# Altium footprint library PcbLib1.PcbLib: 1016 footprints (part 62 of 64)
Each footprint in its own frame and in the unit in brackets; x right, y up, seen from the top. Pads: shape width x height; smd on the part's side, far side on the other; paste and mask are expansions set on the pad; w line width, h text height; cw(c..) or ccw(c..) is an arc to the next point about the centre after c.
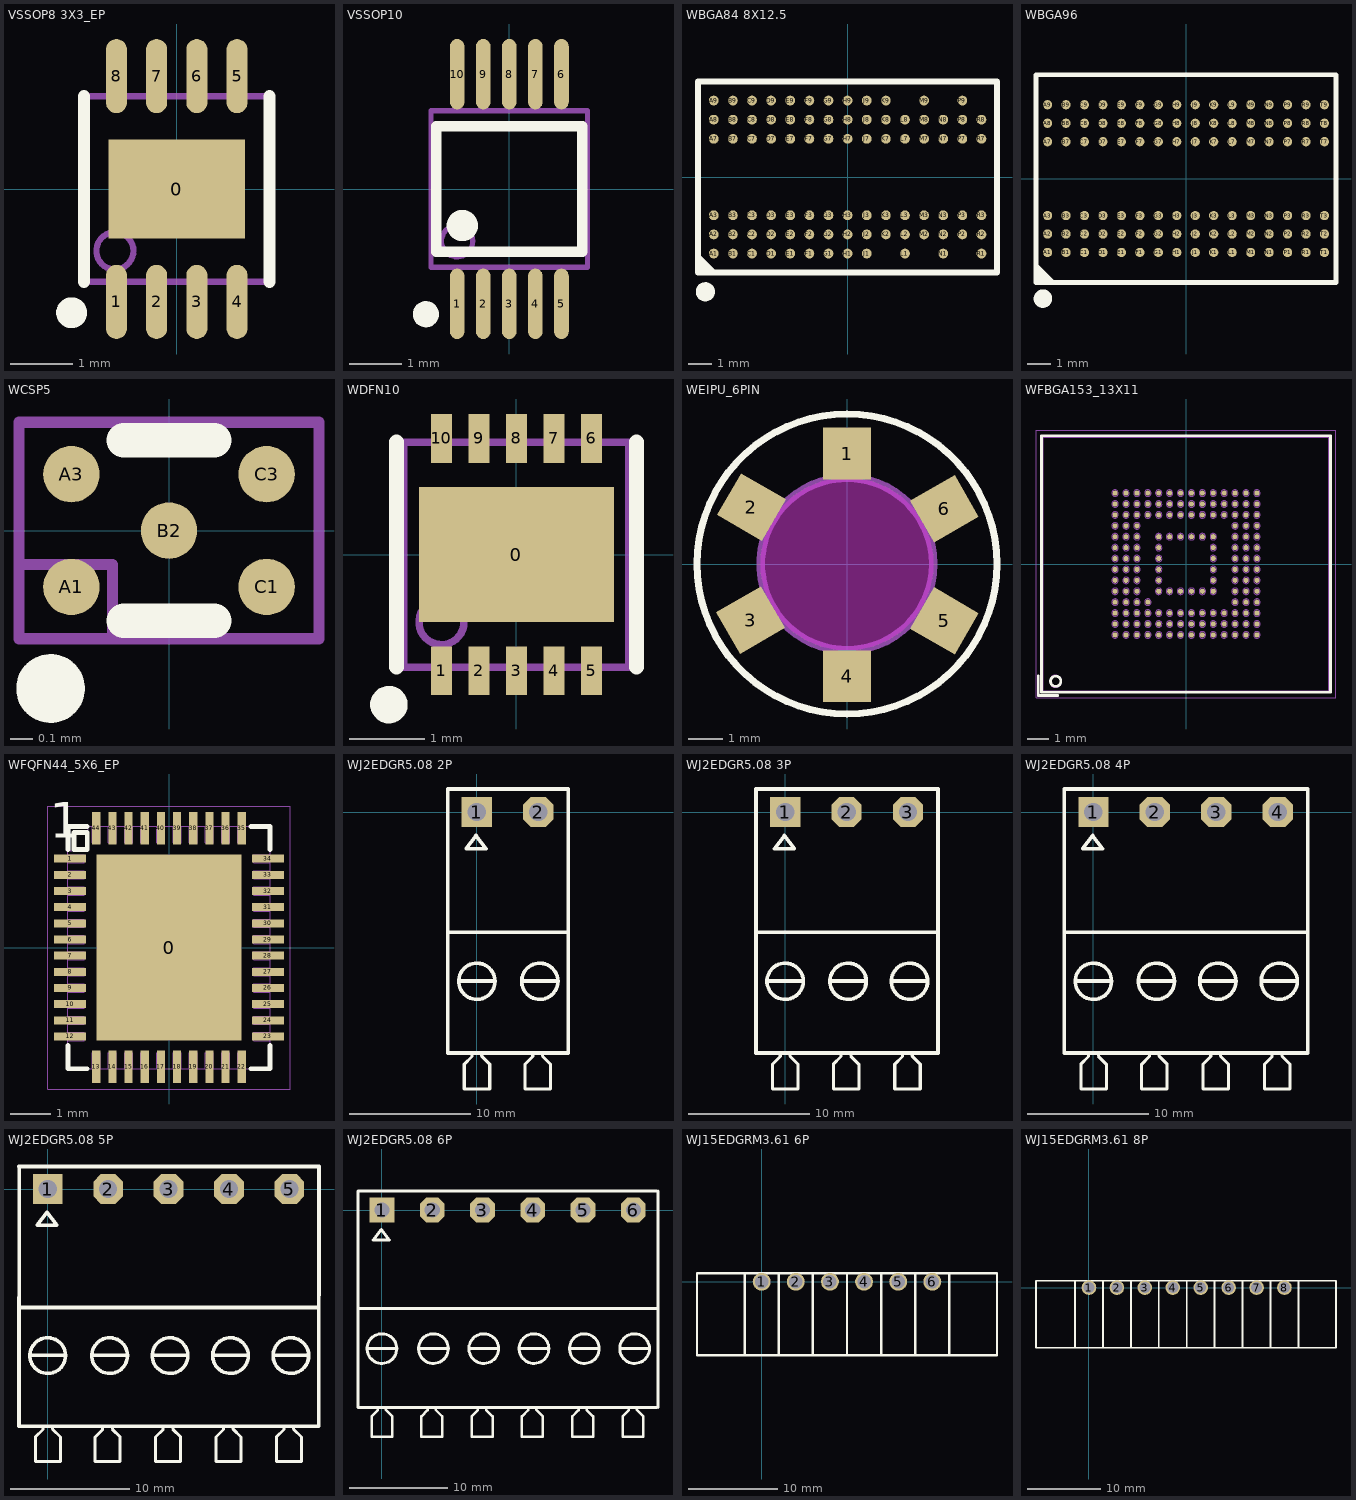
[diagram p61: the footprints below, top view; thin cyan lines are the x and y axes]

## VSSOP8 3X3_EP [mm]
pads (9):
  rect 2.2x1.6 smd mask+0.051: 0(0,0)
  oval 0.34x1.2 smd: 1(-0.975,-1.825) 2(-0.325,-1.825) 3(0.325,-1.825) 4(0.975,-1.825) 5(0.975,1.825) 6(0.325,1.825) 7(-0.325,1.825) 8(-0.975,1.825)
Top Overlay:
  circle w0.25: c-1.7,-2 r0.125
  lines w0.2: -1.5,-1.5 -1.5,1.5 ; 1.5,-1.5 1.5,1.5
Mechanical 13:
  circle w0.1: c-1,-1 r0.3
  lines w0.1: -1.5,-1.5 1.5,-1.5 1.5,1.5 -1.5,1.5 -1.5,-1.5

## VSSOP10 [mm]
pads (10):
  oval 0.28x1.35 smd mask+0.051: 1(-1,-2.2) 2(-0.5,-2.2) 3(0,-2.2) 4(0.5,-2.2) 5(1,-2.2) 6(1,2.2) 7(0.5,2.2) 8(0,2.2) 9(-0.5,2.2) 10(-1,2.2)
Top Overlay:
  circle w0.25: c-1.6,-2.4 r0.125
  circle w0.35: c-0.9,-0.7 r0.125
  lines w0.2: -1.4,-1.2 -1.4,1.2 1.4,1.2 1.4,-1.2 -1.4,-1.2
Mechanical 13:
  circle w0.1: c-1,-1 r0.3
  lines w0.1: -1.5,-1.5 -1.5,1.5 1.5,1.5 1.5,-1.5 -1.5,-1.5

## WBGA84 8X12.5 [mm]
pads (84):
  round 0.41 smd mask+0.051: A1(-5.6,-3.2) A2(-5.6,-2.4) A3(-5.6,-1.6) A7(-5.6,1.6) A8(-5.6,2.4) A9(-5.6,3.2) B1(-4.8,-3.2) B2(-4.8,-2.4) B3(-4.8,-1.6) B7(-4.8,1.6) B8(-4.8,2.4) B9(-4.8,3.2) C1(-4,-3.2) C2(-4,-2.4) C3(-4,-1.6) C7(-4,1.6) C8(-4,2.4) C9(-4,3.2) D1(-3.2,-3.2) D2(-3.2,-2.4) D3(-3.2,-1.6) D7(-3.2,1.6) D8(-3.2,2.4) D9(-3.2,3.2) E1(-2.4,-3.2) E2(-2.4,-2.4) E3(-2.4,-1.6) E7(-2.4,1.6) E8(-2.4,2.4) E9(-2.4,3.2) F1(-1.6,-3.2) F2(-1.6,-2.4) F3(-1.6,-1.6) F7(-1.6,1.6) F8(-1.6,2.4) F9(-1.6,3.2) G1(-0.8,-3.2) G2(-0.8,-2.4) G3(-0.8,-1.6) G7(-0.8,1.6) G8(-0.8,2.4) G9(-0.8,3.2) H1(0,-3.2) H2(0,-2.4) H3(0,-1.6) H7(0,1.6) H8(0,2.4) H9(0,3.2) J1(0.8,-3.2) J2(0.8,-2.4) J3(0.8,-1.6) J7(0.8,1.6) J8(0.8,2.4) J9(0.8,3.2) K2(1.6,-2.4) K3(1.6,-1.6) K7(1.6,1.6) K8(1.6,2.4) K9(1.6,3.2) L1(2.4,-3.2) L2(2.4,-2.4) L3(2.4,-1.6) L7(2.4,1.6) L8(2.4,2.4) M2(3.2,-2.4) M3(3.2,-1.6) M7(3.2,1.6) M8(3.2,2.4) M9(3.2,3.2) N1(4,-3.2) N2(4,-2.4) N3(4,-1.6) N7(4,1.6) N8(4,2.4) P2(4.8,-2.4) P3(4.8,-1.6) P7(4.8,1.6) P8(4.8,2.4) P9(4.8,3.2) R1(5.6,-3.2) R2(5.6,-2.4) R3(5.6,-1.6) R7(5.6,1.6) R8(5.6,2.4)
Top Overlay:
  circle w0.4: c-5.95,-4.8 r0.2
  region: -6.3,-4.07 -5.369,-4.07 -6.296,-3.143 -6.3,-3.143
  lines w0.254: -6.25,-4 6.25,-4 6.25,4 -6.25,4 -6.25,-4

## WBGA96 [mm]
pads (96):
  round 0.4 smd mask+0.051: A1(-6,-3.2) A2(-6,-2.4) A3(-6,-1.6) A7(-6,1.6) A8(-6,2.4) A9(-6,3.2) B1(-5.2,-3.2) B2(-5.2,-2.4) B3(-5.2,-1.6) B7(-5.2,1.6) B8(-5.2,2.4) B9(-5.2,3.2) C1(-4.4,-3.2) C2(-4.4,-2.4) C3(-4.4,-1.6) C7(-4.4,1.6) C8(-4.4,2.4) C9(-4.4,3.2) D1(-3.6,-3.2) D2(-3.6,-2.4) D3(-3.6,-1.6) D7(-3.6,1.6) D8(-3.6,2.4) D9(-3.6,3.2) E1(-2.8,-3.2) E2(-2.8,-2.4) E3(-2.8,-1.6) E7(-2.8,1.6) E8(-2.8,2.4) E9(-2.8,3.2) F1(-2,-3.2) F2(-2,-2.4) F3(-2,-1.6) F7(-2,1.6) F8(-2,2.4) F9(-2,3.2) G1(-1.2,-3.2) G2(-1.2,-2.4) G3(-1.2,-1.6) G7(-1.2,1.6) G8(-1.2,2.4) G9(-1.2,3.2) H1(-0.4,-3.2) H2(-0.4,-2.4) H3(-0.4,-1.6) H7(-0.4,1.6) H8(-0.4,2.4) H9(-0.4,3.2) J1(0.4,-3.2) J2(0.4,-2.4) J3(0.4,-1.6) J7(0.4,1.6) J8(0.4,2.4) J9(0.4,3.2) K1(1.2,-3.2) K2(1.2,-2.4) K3(1.2,-1.6) K7(1.2,1.6) K8(1.2,2.4) K9(1.2,3.2) L1(2,-3.2) L2(2,-2.4) L3(2,-1.6) L7(2,1.6) L8(2,2.4) L9(2,3.2) M1(2.8,-3.2) M2(2.8,-2.4) M3(2.8,-1.6) M7(2.8,1.6) M8(2.8,2.4) M9(2.8,3.2) N1(3.6,-3.2) N2(3.6,-2.4) N3(3.6,-1.6) N7(3.6,1.6) N8(3.6,2.4) N9(3.6,3.2) P1(4.4,-3.2) P2(4.4,-2.4) P3(4.4,-1.6) P7(4.4,1.6) P8(4.4,2.4) P9(4.4,3.2) R1(5.2,-3.2) R2(5.2,-2.4) R3(5.2,-1.6) R7(5.2,1.6) R8(5.2,2.4) R9(5.2,3.2) T1(6,-3.2) T2(6,-2.4) T3(6,-1.6) T7(6,1.6) T8(6,2.4) T9(6,3.2)
Top Overlay:
  circle w0.4: c-6.2,-5.2 r0.2
  region: -6.5,-4.563 -5.569,-4.563 -6.496,-3.637 -6.5,-3.637
  lines w0.2: -6.5,-4.5 6.5,-4.5 6.5,4.5 -6.5,4.5 -6.5,-4.5

## WCSP5 [mm]
pads (5):
  round 0.25 smd mask+0.051: A1(-0.433,-0.25) A3(-0.433,0.25) B2(0,0) C1(0.433,-0.25) C3(0.433,0.25)
Top Overlay:
  circle w0.152: c-0.525,-0.7 r0.076
  lines w0.152: -0.2,-0.4 0.2,-0.4 ; -0.2,0.4 0.2,0.4
Mechanical 13:
  lines w0.05: -0.665,-0.15 -0.25,-0.15 -0.25,-0.48 ; -0.665,-0.48 0.665,-0.48 0.665,0.48 -0.665,0.48 -0.665,-0.48

## WDFN10 [mm]
pads (11):
  rect 2.6x1.8 smd mask+0.051: 0(0,0)
  rect 0.28x0.65 smd mask+0.051: 1(-1,-1.55) 2(-0.5,-1.55) 3(0,-1.55) 4(0.5,-1.55) 5(1,-1.55) 6(1,1.55) 7(0.5,1.55) 8(0,1.55) 9(-0.5,1.55) 10(-1,1.55)
Top Overlay:
  circle w0.25: c-1.7,-2 r0.125
  lines w0.2: -1.6,-1.5 -1.6,1.5 ; 1.6,-1.5 1.6,1.5
Mechanical 13:
  circle w0.1: c-1,-0.9 r0.3
  lines w0.1: -1.5,-1.5 -1.5,1.5 1.5,1.5 1.5,-1.5 -1.5,-1.5

## WEIPU_6PIN [mm]
pads (6):
  rect 1.4x1.5 smd mask+0.051: 1(0,3.2) 4(0,-3.251)
  rect 1.4x1.5 smd rot 60 mask+0.051: 2(-2.769,1.651) 5(2.819,-1.651)
  rect 1.4x1.5 smd rot 120 mask+0.051: 3(-2.794,-1.626) 6(2.819,1.6)
Top Overlay:
  circle w0.203: c0,0 r4.347
Keep-Out Layer:
  board cut-out: 0,-2.5 -0.246,-2.5 -0.729,-2.404 -1.184,-2.215 -1.594,-1.942 -1.942,-1.594 -2.215,-1.184 -2.404,-0.729 -2.5,-0.246 -2.5,0 -2.5,0.246 -2.404,0.729 -2.215,1.184 -1.942,1.594 -1.594,1.942 -1.184,2.215 -0.729,2.404 -0.246,2.5 0,2.5 0.246,2.5 0.729,2.404 1.184,2.215 1.594,1.942 1.942,1.594 2.215,1.184 2.404,0.729 2.5,0.246 2.5,0 2.5,-0.246 2.404,-0.729 2.215,-1.184 1.942,-1.594 1.594,-1.942 1.184,-2.215 0.729,-2.404 0.246,-2.5
Mechanical 1:
  circle w0.254: c0,0 r2.5

## WFBGA153_13X11 [mm]
pads (153):
  round 0.23 smd mask+0.05: A1(-3.25,-3.25) A2(-3.25,-2.75) A3(-3.25,-2.25) A4(-3.25,-1.75) A5(-3.25,-1.25) A6(-3.25,-0.75) A7(-3.25,-0.25) A8(-3.25,0.25) A9(-3.25,0.75) A10(-3.25,1.25) A11(-3.25,1.75) A12(-3.25,2.25) A13(-3.25,2.75) A14(-3.25,3.25) B1(-2.75,-3.25) B2(-2.75,-2.75) B3(-2.75,-2.25) B4(-2.75,-1.75) B5(-2.75,-1.25) B6(-2.75,-0.75) B7(-2.75,-0.25) B8(-2.75,0.25) B9(-2.75,0.75) B10(-2.75,1.25) B11(-2.75,1.75) B12(-2.75,2.25) B13(-2.75,2.75) B14(-2.75,3.25) C1(-2.25,-3.25) C2(-2.25,-2.75) C3(-2.25,-2.25) C4(-2.25,-1.75) C5(-2.25,-1.25) C6(-2.25,-0.75) C7(-2.25,-0.25) C8(-2.25,0.25) C9(-2.25,0.75) C10(-2.25,1.25) C11(-2.25,1.75) C12(-2.25,2.25) C13(-2.25,2.75) C14(-2.25,3.25) D1(-1.75,-3.25) D2(-1.75,-2.75) D3(-1.75,-2.25) D4(-1.75,-1.75) D12(-1.75,2.25) D13(-1.75,2.75) D14(-1.75,3.25) E1(-1.25,-3.25) E2(-1.25,-2.75) E3(-1.25,-2.25) E5(-1.25,-1.25) E6(-1.25,-0.75) E7(-1.25,-0.25) E8(-1.25,0.25) E9(-1.25,0.75) E10(-1.25,1.25) E12(-1.25,2.25) E13(-1.25,2.75) E14(-1.25,3.25) F1(-0.75,-3.25) F2(-0.75,-2.75) F3(-0.75,-2.25) F5(-0.75,-1.25) F10(-0.75,1.25) F12(-0.75,2.25) F13(-0.75,2.75) F14(-0.75,3.25) G1(-0.25,-3.25) G2(-0.25,-2.75) G3(-0.25,-2.25) G5(-0.25,-1.25) G10(-0.25,1.25) G12(-0.25,2.25) G13(-0.25,2.75) G14(-0.25,3.25) H1(0.25,-3.25) H2(0.25,-2.75) H3(0.25,-2.25) H5(0.25,-1.25) H10(0.25,1.25) H12(0.25,2.25) H13(0.25,2.75) H14(0.25,3.25) J1(0.75,-3.25) J2(0.75,-2.75) J3(0.75,-2.25) J5(0.75,-1.25) J10(0.75,1.25) J12(0.75,2.25) J13(0.75,2.75) J14(0.75,3.25) K1(1.25,-3.25) K2(1.25,-2.75) K3(1.25,-2.25) K5(1.25,-1.25) K6(1.25,-0.75) K7(1.25,-0.25) K8(1.25,0.25) K9(1.25,0.75) K10(1.25,1.25) K12(1.25,2.25) K13(1.25,2.75) K14(1.25,3.25) L1(1.75,-3.25) L2(1.75,-2.75) L3(1.75,-2.25) L12(1.75,2.25) L13(1.75,2.75) L14(1.75,3.25) M1(2.25,-3.25) M2(2.25,-2.75) M3(2.25,-2.25) M4(2.25,-1.75) M5(2.25,-1.25) M6(2.25,-0.75) M7(2.25,-0.25) M8(2.25,0.25) M9(2.25,0.75) M10(2.25,1.25) M11(2.25,1.75) M12(2.25,2.25) M13(2.25,2.75) M14(2.25,3.25) N1(2.75,-3.25) N2(2.75,-2.75) N3(2.75,-2.25) N4(2.75,-1.75) N5(2.75,-1.25) N6(2.75,-0.75) N7(2.75,-0.25) N8(2.75,0.25) N9(2.75,0.75) N10(2.75,1.25) N11(2.75,1.75) N12(2.75,2.25) N13(2.75,2.75) N14(2.75,3.25) P1(3.25,-3.25) P2(3.25,-2.75) P3(3.25,-2.25) P4(3.25,-1.75) P5(3.25,-1.25) P6(3.25,-0.75) P7(3.25,-0.25) P8(3.25,0.25) P9(3.25,0.75) P10(3.25,1.25) P11(3.25,1.75) P12(3.25,2.25) P13(3.25,2.75) P14(3.25,3.25)
Top Overlay:
  circle w0.12: c-5.975,-5.375 r0.236
  lines w0.12: -6.775,-5.125 -6.775,-6.025 -5.875,-6.025 ; -6.625,-5.875 6.625,-5.875 6.625,5.875 -6.625,5.875 -6.625,-5.875
Mechanical 14:
  drawing of 158 lines, arcs and shapes, not listed
Mechanical 16:
  lines w0.01: -6.875,-6.125 6.875,-6.125 6.875,6.125 -6.875,6.125 -6.875,-6.125
3D body "WFBGA-153.STEP": height 0.78, standoff -0.02, extent -6.5,-5.75 6.5,5.75
3D body: height 1, standoff 0, extent -6.555,-5.805 6.555,5.805

## WFQFN44_5X6_EP [mm]
pads (45):
  rect 3.6x4.6 smd paste-1.8 mask+0.05: 0(0,0)
  rect 0.8x0.2 smd mask+0.05: 1(-2.45,2.2) 2(-2.45,1.8) 3(-2.45,1.4) 4(-2.45,1) 5(-2.45,0.6) 6(-2.45,0.2) 7(-2.45,-0.2) 8(-2.45,-0.6) 9(-2.45,-1) 10(-2.45,-1.4) 11(-2.45,-1.8) 12(-2.45,-2.2) 23(2.45,-2.2) 24(2.45,-1.8) 25(2.45,-1.4) 26(2.45,-1) 27(2.45,-0.6) 28(2.45,-0.2) 29(2.45,0.2) 30(2.45,0.6) 31(2.45,1) 32(2.45,1.4) 33(2.45,1.8) 34(2.45,2.2)
  rect 0.2x0.8 smd mask+0.05: 13(-1.8,-2.95) 14(-1.4,-2.95) 15(-1,-2.95) 16(-0.6,-2.95) 17(-0.2,-2.95) 18(0.2,-2.95) 19(0.6,-2.95) 20(1,-2.95) 21(1.4,-2.95) 22(1.8,-2.95) 35(1.8,2.95) 36(1.4,2.95) 37(1,2.95) 38(0.6,2.95) 39(0.2,2.95) 40(-0.2,2.95) 41(-0.6,2.95) 42(-1,2.95) 43(-1.4,2.95) 44(-1.8,2.95)
Top Overlay:
  lines w0.12: -2.5,-2.425 -2.5,-3 -2.025,-3 ; -2.5,2.425 -2.5,3 -2.025,3 ; 2.025,-3 2.5,-3 2.5,-2.425 ; 2.025,3 2.5,3 2.5,2.425 ; -2.35,2.425 -2.35,2.85 -2.025,2.85 -2.025,2.425 -2.35,2.425
  text "1" at -2.95,2.425 h1.5
Top Paste:
  rectangle: -0.5,0.1 -0.1,0.475
  rectangle: -0.5,0.675 -0.1,1.05
  rectangle: -0.5,1.25 -0.1,1.625
  rectangle: -0.5,1.825 -0.1,2.2
  rectangle: -1.1,1.825 -0.7,2.2
  rectangle: -1.1,1.25 -0.7,1.625
  rectangle: -1.1,0.675 -0.7,1.05
  rectangle: -1.1,0.1 -0.7,0.475
  rectangle: -1.7,1.825 -1.3,2.2
  rectangle: -1.7,1.25 -1.3,1.625
  rectangle: -1.7,0.675 -1.3,1.05
  rectangle: -1.7,0.1 -1.3,0.475
  rectangle: 0.1,0.1 0.5,0.475
  rectangle: 0.1,0.675 0.5,1.05
  rectangle: 0.1,1.25 0.5,1.625
  rectangle: 0.1,1.825 0.5,2.2
  rectangle: 0.7,0.1 1.1,0.475
  rectangle: 0.7,0.675 1.1,1.05
  rectangle: 0.7,1.25 1.1,1.625
  rectangle: 0.7,1.825 1.1,2.2
  rectangle: 1.3,1.825 1.7,2.2
  rectangle: 1.3,1.25 1.7,1.625
  rectangle: 1.3,0.675 1.7,1.05
  rectangle: 1.3,0.1 1.7,0.475
  rectangle: -1.7,-2.2 -1.3,-1.825
  rectangle: -1.7,-1.625 -1.3,-1.25
  rectangle: -1.7,-1.05 -1.3,-0.675
  rectangle: -1.7,-0.475 -1.3,-0.1
  rectangle: -1.1,-2.2 -0.7,-1.825
  rectangle: -1.1,-1.625 -0.7,-1.25
  rectangle: -1.1,-1.05 -0.7,-0.675
  rectangle: -1.1,-0.475 -0.7,-0.1
  rectangle: -0.5,-0.475 -0.1,-0.1
  rectangle: -0.5,-1.05 -0.1,-0.675
  rectangle: -0.5,-1.625 -0.1,-1.25
  rectangle: -0.5,-2.2 -0.1,-1.825
  rectangle: 0.1,-2.2 0.5,-1.825
  rectangle: 0.1,-1.625 0.5,-1.25
  rectangle: 0.1,-1.05 0.5,-0.675
  rectangle: 0.1,-0.475 0.5,-0.1
  rectangle: 0.7,-2.2 1.1,-1.825
  rectangle: 0.7,-1.625 1.1,-1.25
  rectangle: 0.7,-1.05 1.1,-0.675
  rectangle: 0.7,-0.475 1.1,-0.1
  rectangle: 1.3,-0.475 1.7,-0.1
  rectangle: 1.3,-1.05 1.7,-0.675
  rectangle: 1.3,-1.625 1.7,-1.25
  rectangle: 1.3,-2.2 1.7,-1.825
Mechanical 14:
  lines w0.01: -2.5,-2.3 -2.1,-2.3 -2.1,-2.1 -2.5,-2.1 ; -2.5,-1.9 -2.1,-1.9 -2.1,-1.7 -2.5,-1.7 ; -2.5,-1.5 -2.1,-1.5 -2.1,-1.3 -2.5,-1.3 ; -2.5,-1.1 -2.1,-1.1 -2.1,-0.9 -2.5,-0.9 ; -2.5,-0.7 -2.1,-0.7 -2.1,-0.5 -2.5,-0.5 ; -2.5,-0.3 -2.1,-0.3 -2.1,-0.1 -2.5,-0.1 ; -2.5,0.1 -2.1,0.1 -2.1,0.3 -2.5,0.3 ; -2.5,0.5 -2.1,0.5 -2.1,0.7 -2.5,0.7 ; -2.5,0.9 -2.1,0.9 -2.1,1.1 -2.5,1.1 ; -2.5,1.3 -2.1,1.3 -2.1,1.5 -2.5,1.5 ; -2.5,1.7 -2.1,1.7 -2.1,1.9 -2.5,1.9 ; -2.5,2.1 -2.1,2.1 -2.1,2.3 -2.5,2.3 ; -1.9,-3 -1.9,-2.6 -1.7,-2.6 -1.7,-3 ; -1.9,3 -1.9,2.6 -1.7,2.6 -1.7,3 ; -1.5,-3 -1.5,-2.6 -1.3,-2.6 -1.3,-3 ; -1.5,3 -1.5,2.6 -1.3,2.6 -1.3,3 ; -1.1,-3 -1.1,-2.6 -0.9,-2.6 -0.9,-3 ; -1.1,3 -1.1,2.6 -0.9,2.6 -0.9,3 ; -0.7,-3 -0.7,-2.6 -0.5,-2.6 -0.5,-3 ; -0.7,3 -0.7,2.6 -0.5,2.6 -0.5,3 ; -0.3,-3 -0.3,-2.6 -0.1,-2.6 -0.1,-3 ; -0.3,3 -0.3,2.6 -0.1,2.6 -0.1,3 ; 0.1,-3 0.1,-2.6 0.3,-2.6 0.3,-3 ; 0.1,3 0.1,2.6 0.3,2.6 0.3,3 ; 0.5,-3 0.5,-2.6 0.7,-2.6 0.7,-3 ; 0.5,3 0.5,2.6 0.7,2.6 0.7,3 ; 0.9,-3 0.9,-2.6 1.1,-2.6 1.1,-3 ; 0.9,3 0.9,2.6 1.1,2.6 1.1,3 ; 1.3,-3 1.3,-2.6 1.5,-2.6 1.5,-3 ; 1.3,3 1.3,2.6 1.5,2.6 1.5,3 ; 1.7,-3 1.7,-2.6 1.9,-2.6 1.9,-3 ; 1.7,3 1.7,2.6 1.9,2.6 1.9,3 ; 2.5,-2.3 2.1,-2.3 2.1,-2.1 2.5,-2.1 ; 2.5,-1.9 2.1,-1.9 2.1,-1.7 2.5,-1.7 ; 2.5,-1.5 2.1,-1.5 2.1,-1.3 2.5,-1.3 ; 2.5,-1.1 2.1,-1.1 2.1,-0.9 2.5,-0.9 ; 2.5,-0.7 2.1,-0.7 2.1,-0.5 2.5,-0.5 ; 2.5,-0.3 2.1,-0.3 2.1,-0.1 2.5,-0.1 ; 2.5,0.1 2.1,0.1 2.1,0.3 2.5,0.3 ; 2.5,0.5 2.1,0.5 2.1,0.7 2.5,0.7 ; 2.5,0.9 2.1,0.9 2.1,1.1 2.5,1.1 ; 2.5,1.3 2.1,1.3 2.1,1.5 2.5,1.5 ; 2.5,1.7 2.1,1.7 2.1,1.9 2.5,1.9 ; 2.5,2.1 2.1,2.1 2.1,2.3 2.5,2.3 ; -2.5,-3 -2.5,3 2.5,3 2.5,-3 -2.5,-3 ; -2.45,2.4 -2,2.4 -2,2.95 -2.45,2.95 -2.45,2.4 ; -1.75,-2.25 1.75,-2.25 1.75,2.25 -1.5,2.25 -1.75,2 -1.75,-2.25
  text "44" at -2.04,3.05 h0.5
  text "35" at 1.58,3.06 h0.5
  text "34" at 2.525,2.05 h0.5
  text "23" at 2.525,-2.35 h0.5
  text "22" at 1.56,-3.36 h0.5
  text "13" at -2.02,-3.36 h0.5
  text "12" at -2.95,-2.375 h0.5
  text "1" at -2.675,2.05 h0.5
Mechanical 16:
  lines w0.01: -3,-3.5 -2.975,-3.5 3,-3.5 3,3.5 -3,3.5 -3,2.35 -3,-3.5
3D body: height 0.02, standoff 0, extent -1.725,-2.225 1.725,2.225
3D body: height 0.81, standoff 0.8, extent -2.45,2.4 -2,2.95
3D body: height 0.02, standoff 0, extent -1.9,2.6 -1.7,3
3D body: height 0.02, standoff 0, extent -1.5,2.6 -1.3,3
3D body: height 0.02, standoff 0, extent -1.1,2.6 -0.9,3
3D body: height 0.02, standoff 0, extent -0.7,2.6 -0.5,3
3D body: height 0.02, standoff 0, extent -0.3,2.6 -0.1,3
3D body: height 0.02, standoff 0, extent 0.1,2.6 0.3,3
3D body: height 0.02, standoff 0, extent 0.5,2.6 0.7,3
3D body: height 0.02, standoff 0, extent 0.9,2.6 1.1,3
3D body: height 0.02, standoff 0, extent 1.3,2.6 1.5,3
3D body: height 0.02, standoff 0, extent 1.7,2.6 1.9,3
3D body: height 0.02, standoff 0, extent 2.1,2.1 2.5,2.3
3D body: height 0.02, standoff 0, extent 2.1,1.7 2.5,1.9
3D body: height 0.02, standoff 0, extent 2.1,1.3 2.5,1.5
3D body: height 0.02, standoff 0, extent 2.1,0.9 2.5,1.1
3D body: height 0.02, standoff 0, extent 2.1,0.5 2.5,0.7
3D body: height 0.02, standoff 0, extent 2.1,0.1 2.5,0.3
3D body: height 0.02, standoff 0, extent 2.1,-0.3 2.5,-0.1
3D body: height 0.02, standoff 0, extent 2.1,-0.7 2.5,-0.5
3D body: height 0.02, standoff 0, extent 2.1,-1.1 2.5,-0.9
3D body: height 0.02, standoff 0, extent 2.1,-1.5 2.5,-1.3
3D body: height 0.02, standoff 0, extent 2.1,-1.9 2.5,-1.7
3D body: height 0.02, standoff 0, extent 2.1,-2.3 2.5,-2.1
3D body: height 0.02, standoff 0, extent 1.7,-3 1.9,-2.6
3D body: height 0.02, standoff 0, extent 1.3,-3 1.5,-2.6
3D body: height 0.02, standoff 0, extent 0.9,-3 1.1,-2.6
3D body: height 0.02, standoff 0, extent 0.5,-3 0.7,-2.6
3D body: height 0.02, standoff 0, extent 0.1,-3 0.3,-2.6
3D body: height 0.02, standoff 0, extent -0.3,-3 -0.1,-2.6
3D body: height 0.02, standoff 0, extent -0.7,-3 -0.5,-2.6
3D body: height 0.02, standoff 0, extent -1.1,-3 -0.9,-2.6
3D body: height 0.02, standoff 0, extent -1.5,-3 -1.3,-2.6
3D body: height 0.02, standoff 0, extent -1.9,-3 -1.7,-2.6
3D body: height 0.02, standoff 0, extent -2.5,-2.3 -2.1,-2.1
3D body: height 0.02, standoff 0, extent -2.5,-1.9 -2.1,-1.7
3D body: height 0.02, standoff 0, extent -2.5,-1.5 -2.1,-1.3
3D body: height 0.02, standoff 0, extent -2.5,-1.1 -2.1,-0.9
3D body: height 0.02, standoff 0, extent -2.5,-0.7 -2.1,-0.5
3D body: height 0.02, standoff 0, extent -2.5,-0.3 -2.1,-0.1
3D body: height 0.02, standoff 0, extent -2.5,0.1 -2.1,0.3
3D body: height 0.02, standoff 0, extent -2.5,0.5 -2.1,0.7
3D body: height 0.02, standoff 0, extent -2.5,0.9 -2.1,1.1
3D body: height 0.02, standoff 0, extent -2.5,1.3 -2.1,1.5
3D body: height 0.02, standoff 0, extent -2.5,1.7 -2.1,1.9
3D body: height 0.02, standoff 0, extent -2.5,2.1 -2.1,2.3
3D body: height 0.8, standoff 0.02, extent -2.5,-3 2.5,3

## WJ2EDGR5.08 2P [mm]
height 12.7
pads (2):
  rect 2.5x2.5 hole 1.524: 1(0,0)
  oct 2.5x2.5 hole 1.524: 2(5.08,0)
Top Overlay:
  circle w0.305: c0,-14 r1.5
  circle w0.305: c5.207,-14 r1.5
  lines w0.254: -0.406,-19.99 -0.406,-20.218 -1.041,-20.853 -1.041,-22.911 1.067,-22.911 1.067,-20.853 0.406,-20.193 0.406,-19.964 0.356,-19.914 ; 4.623,-19.99 4.623,-20.218 3.988,-20.853 3.988,-22.911 6.096,-22.911 6.096,-20.853 5.436,-20.193 5.436,-19.964 5.385,-19.914
  lines w0.305: -2.413,1.905 7.518,1.905 ; -2.411,1.905 -2.417,-19.939 7.565,-19.939 7.571,1.905 ; -2.362,-9.957 7.569,-9.957 ; -1.397,-13.97 1.397,-13.97 ; 3.81,-13.97 6.604,-13.97 ; -0.889,-3.048 -0.064,-1.947 0.762,-3.048 0.508,-3.048 -0.889,-3.048
3D body "User Library-MSTB 2,5-2-G-5,08 1770711.STEP": height 8.7, standoff -3.4, extent -2.515,-10.04 7.645,1.962

## WJ2EDGR5.08 3P [mm]
height 12.7
pads (3):
  rect 2.5x2.5 hole 1.524: 1(0,0)
  oct 2.5x2.5 hole 1.524: 2(5.08,0) 3(10.16,0)
Top Overlay:
  circle w0.305: c10.287,-14 r1.5
  circle w0.305: c0,-14 r1.5
  circle w0.305: c5.207,-14 r1.5
  lines w0.254: -0.406,-19.99 -0.406,-20.218 -1.041,-20.853 -1.041,-22.911 1.067,-22.911 1.067,-20.853 0.406,-20.193 0.406,-19.964 0.356,-19.914 ; 4.623,-19.99 4.623,-20.218 3.988,-20.853 3.988,-22.911 6.096,-22.911 6.096,-20.853 5.436,-20.193 5.436,-19.964 5.385,-19.914 ; 9.703,-19.99 9.703,-20.218 9.068,-20.853 9.068,-22.911 11.176,-22.911 11.176,-20.853 10.516,-20.193 10.516,-19.964 10.465,-19.914
  lines w0.305: -2.413,1.905 12.651,1.905 12.645,-19.939 -2.417,-19.939 -2.411,1.905 ; -2.388,-9.957 12.649,-9.957 ; -1.397,-13.97 1.397,-13.97 ; 3.81,-13.97 6.604,-13.97 ; 8.89,-13.97 11.684,-13.97 ; -0.889,-3.048 -0.064,-1.947 0.762,-3.048 0.508,-3.048 -0.889,-3.048
3D body "User Library-MSTB 2,5-3-G-5,08 1759020.SLDPRT": height 8.7, standoff -3.4, extent -2.515,-10.04 12.725,1.962

## WJ2EDGR5.08 4P [mm]
height 12.7
pads (4):
  rect 2.5x2.5 hole 1.524: 1(0,0)
  oct 2.5x2.5 hole 1.524: 2(5.08,0) 3(10.16,0) 4(15.24,0)
Top Overlay:
  circle w0.305: c15.367,-14 r1.5
  circle w0.305: c5.207,-14 r1.5
  circle w0.305: c0,-14 r1.5
  circle w0.305: c10.287,-14 r1.5
  lines w0.254: -0.406,-19.99 -0.406,-20.218 -1.041,-20.853 -1.041,-22.911 1.067,-22.911 1.067,-20.853 0.406,-20.193 0.406,-19.964 0.356,-19.914 ; 4.623,-19.99 4.623,-20.218 3.988,-20.853 3.988,-22.911 6.096,-22.911 6.096,-20.853 5.436,-20.193 5.436,-19.964 5.385,-19.914 ; 9.703,-19.99 9.703,-20.218 9.068,-20.853 9.068,-22.911 11.176,-22.911 11.176,-20.853 10.516,-20.193 10.516,-19.964 10.465,-19.914 ; 14.783,-19.99 14.783,-20.218 14.148,-20.853 14.148,-22.911 16.256,-22.911 16.256,-20.853 15.596,-20.193 15.596,-19.964 15.545,-19.914
  lines w0.305: -2.413,1.905 17.679,1.905 ; -2.411,1.905 -2.417,-19.939 17.673,-19.939 ; -2.388,-9.957 17.728,-9.957 ; -1.397,-13.97 1.397,-13.97 ; 3.81,-13.97 6.604,-13.97 ; 8.89,-13.97 11.684,-13.97 ; 13.97,-13.97 16.764,-13.97 ; 17.725,-19.939 17.731,1.905 ; -0.889,-3.048 0.508,-3.048 0.762,-3.048 -0.064,-1.947 -0.889,-3.048
3D body "User Library-MSTB 2,5-4-G-5,08 1759033.STEP": height 8.7, standoff -3.4, extent -2.515,-10.04 17.805,1.962

## WJ2EDGR5.08 5P [mm]
height 12.7
pads (5):
  rect 2.5x2.5 hole 1.524: 1(0,0)
  oct 2.5x2.5 hole 1.524: 2(5.08,0) 3(10.16,0) 4(15.24,0) 5(20.32,0)
Top Overlay:
  circle w0.305: c10.287,-14 r1.5
  circle w0.305: c0,-14 r1.5
  circle w0.305: c5.207,-14 r1.5
  circle w0.305: c15.367,-14 r1.5
  circle w0.305: c20.447,-14 r1.5
  lines w0.254: -0.406,-19.99 -0.406,-20.218 -1.041,-20.853 -1.041,-22.911 1.067,-22.911 1.067,-20.853 0.406,-20.193 0.406,-19.964 0.356,-19.914 ; 4.623,-19.99 4.623,-20.218 3.988,-20.853 3.988,-22.911 6.096,-22.911 6.096,-20.853 5.436,-20.193 5.436,-19.964 5.385,-19.914 ; 9.703,-19.99 9.703,-20.218 9.068,-20.853 9.068,-22.911 11.176,-22.911 11.176,-20.853 10.516,-20.193 10.516,-19.964 10.465,-19.914 ; 14.783,-19.99 14.783,-20.218 14.148,-20.853 14.148,-22.911 16.256,-22.911 16.256,-20.853 15.596,-20.193 15.596,-19.964 15.545,-19.914 ; 19.863,-19.99 19.863,-20.218 19.228,-20.853 19.228,-22.911 21.336,-22.911 21.336,-20.853 20.676,-20.193 20.676,-19.964 20.625,-19.914
  lines w0.305: -2.413,1.905 22.811,1.905 22.805,-19.939 -2.417,-19.939 -2.411,1.905 ; -2.388,-9.957 22.682,-9.957 ; -1.397,-13.97 1.397,-13.97 ; 3.81,-13.97 6.604,-13.97 ; 8.89,-13.97 11.684,-13.97 ; 13.97,-13.97 16.764,-13.97 ; 19.05,-13.97 21.844,-13.97 ; -0.889,-3.048 -0.064,-1.947 0.762,-3.048 0.508,-3.048 -0.889,-3.048
3D body "User Library-MSTB 2,5-5-G-5,08 1759046.STEP": height 8.7, standoff -3.4, extent -2.515,-10.04 22.885,1.962

## WJ2EDGR5.08 6P [mm]
height 12.7
pads (6):
  rect 2.5x2.5 hole 1.524: 1(0,0)
  oct 2.5x2.5 hole 1.524: 2(5.08,0) 3(10.16,0) 4(15.24,0) 5(20.32,0) 6(25.4,0)
Top Overlay:
  circle w0.305: c20.447,-14 r1.5
  circle w0.305: c15.367,-14 r1.5
  circle w0.305: c5.207,-14 r1.5
  circle w0.305: c0,-14 r1.5
  circle w0.305: c10.287,-14 r1.5
  circle w0.305: c25.527,-14 r1.5
  lines w0.254: -0.406,-19.99 -0.406,-20.218 -1.041,-20.853 -1.041,-22.911 1.067,-22.911 1.067,-20.853 0.406,-20.193 0.406,-19.964 0.356,-19.914 ; 4.623,-19.99 4.623,-20.218 3.988,-20.853 3.988,-22.911 6.096,-22.911 6.096,-20.853 5.436,-20.193 5.436,-19.964 5.385,-19.914 ; 9.703,-19.99 9.703,-20.218 9.068,-20.853 9.068,-22.911 11.176,-22.911 11.176,-20.853 10.516,-20.193 10.516,-19.964 10.465,-19.914 ; 14.783,-19.99 14.783,-20.218 14.148,-20.853 14.148,-22.911 16.256,-22.911 16.256,-20.853 15.596,-20.193 15.596,-19.964 15.545,-19.914 ; 19.863,-19.99 19.863,-20.218 19.228,-20.853 19.228,-22.911 21.336,-22.911 21.336,-20.853 20.676,-20.193 20.676,-19.964 20.625,-19.914 ; 24.943,-19.99 24.943,-20.218 24.308,-20.853 24.308,-22.911 26.416,-22.911 26.416,-20.853 25.756,-20.193 25.756,-19.964 25.705,-19.914
  lines w0.305: -2.413,1.905 27.764,1.905 ; -2.411,1.905 -2.417,-19.939 27.758,-19.939 ; -2.388,-9.957 27.788,-9.957 ; -1.397,-13.97 1.397,-13.97 ; 3.81,-13.97 6.604,-13.97 ; 8.89,-13.97 11.684,-13.97 ; 13.97,-13.97 16.764,-13.97 ; 19.05,-13.97 21.844,-13.97 ; 24.13,-13.97 26.924,-13.97 ; 27.885,-19.939 27.891,1.905 ; -0.889,-3.048 0.508,-3.048 0.762,-3.048 -0.064,-1.947 -0.889,-3.048
3D body "User Library-MSTB 2,5-6-G-5,08 1759059.STEP": height 8.7, standoff -3.4, extent -2.515,-10.04 27.965,1.962

## WJ15EDGRM3.61 6P [mm]
pads (6):
  round 2 hole 1.5: 1(0,0) 2(3.81,0) 3(7.62,0) 4(11.43,0) 5(15.24,0) 6(19.05,0)
Top Overlay:
  lines w0.254: -7.225,0.896 -7.225,-8.204 26.275,-8.204 26.275,0.896 ; -7.225,0.94 -0.025,0.94 26.275,0.94 ; -1.905,-8.204 -1.905,0.889 ; 1.905,-8.179 1.905,0.914 ; 5.715,-8.179 5.715,0.94 ; 9.525,-8.128 9.525,0.787 ; 13.335,-8.103 13.335,0.864 ; 17.145,-8.179 17.145,0.838 ; 20.955,-8.153 20.955,0.889
3D body: height 0.25, standoff 0, extent 0.61,3.988 0.61,3.988

## WJ15EDGRM3.61 8P [mm]
pads (8):
  round 2 hole 1.5: 1(0,0) 2(3.81,0) 3(7.62,0) 4(11.43,0) 5(15.24,0) 6(19.05,0) 7(22.86,0) 8(26.67,0)
Top Overlay:
  lines w0.254: -7.225,0.896 -7.225,-8.204 33.68,-8.204 33.698,-8.187 33.698,0.922 33.68,0.94 -0.025,0.94 -7.225,0.94 ; -1.905,-8.204 -1.905,0.889 ; 1.905,-8.179 1.905,0.914 ; 5.715,-8.179 5.715,0.94 ; 9.525,-8.128 9.525,0.787 ; 13.335,-8.103 13.335,0.864 ; 17.145,-8.179 17.145,0.838 ; 20.955,-8.153 20.955,0.889 ; 24.765,-8.153 24.765,0.914 ; 28.575,-8.179 28.575,0.914
3D body "38147.stp": height 7.25, standoff -3.4, extent -7.176,-8.235 33.694,1.065
3D body: height 0.25, standoff 0, extent 0.61,3.988 0.61,3.988